# Altium footprint library Capacitors.PcbLib: 93 footprints (part 2 of 6)
Each footprint in its own frame and in the unit in brackets; x right, y up, seen from the top. Pads: shape width x height; smd on the part's side, far side on the other; paste and mask are expansions set on the pad; w line width, h text height; cw(c..) or ccw(c..) is an arc to the next point about the centre after c.
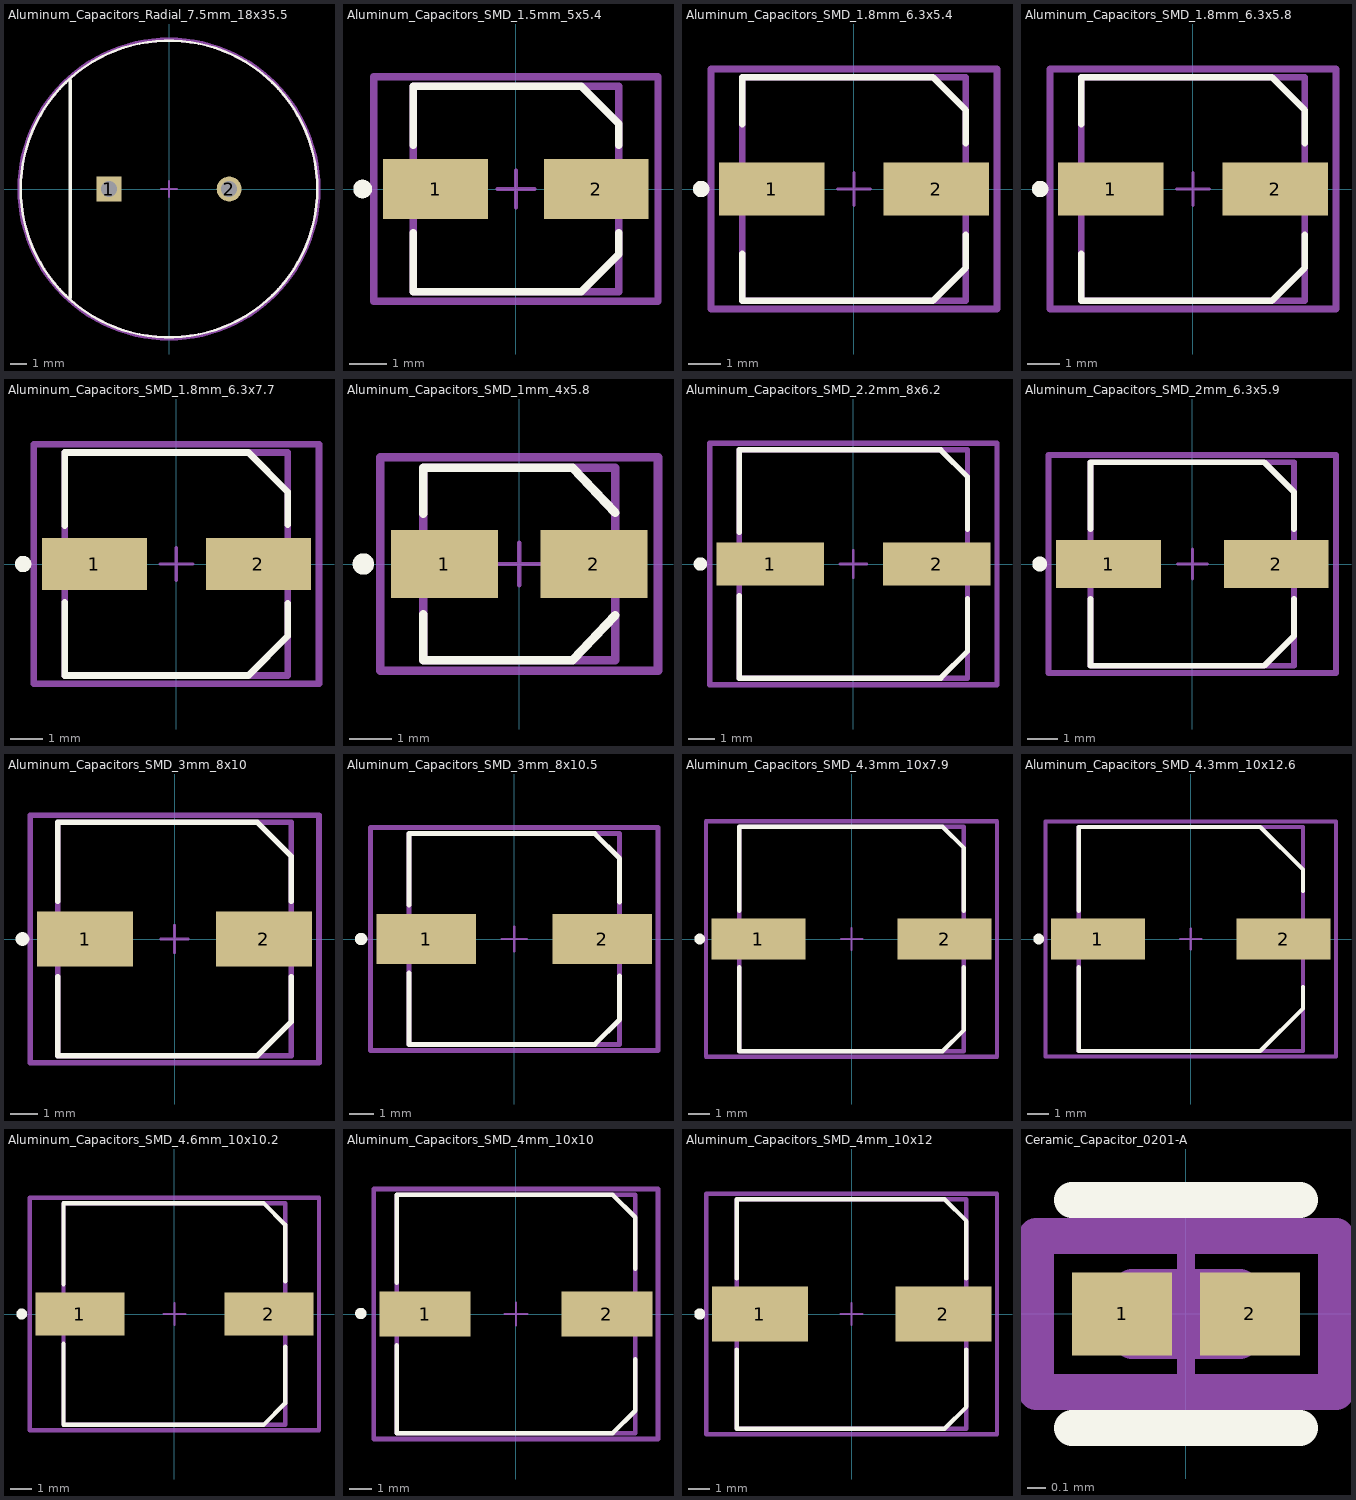
[diagram p1: the footprints below, top view; thin cyan lines are the x and y axes]

## Aluminum_Capacitors_Radial_7.5mm_18x35.5 [mm]
pads (2):
  rect 1.55x1.55 hole 1 paste-2539.97 mask+0: 1(-3.75,0)
  round 1.55 hole 1 paste-2539.97 mask+0: 2(3.75,0)
Top Overlay:
  circle w0.15: c0,0 r9.25
  lines w0.2: -6.15,-6.8 -6.15,6.8
Top 3D Body:
  circle w0.15: c0,0 r9.25
Top Courtyard:
  lines w0.2: -9.35,0 cw(c0,0) 9.35,0 cw(c0,0) -9.35,0
Top Component Center:
  lines w0.1: -0.5,0 0.5,0 ; 0,-0.5 0,0.5
3D body "Cap_Panasonic_ECA1VM472E_eec.STEP": height 0.25, standoff 0, extent -9.35,-9.35 9.35,9.35

## Aluminum_Capacitors_SMD_1.5mm_5x5.4 [mm]
pads (2):
  rect 2.8x1.6 smd paste+0 mask+0: 1(-2.15,0) 2(2.15,0)
Top Overlay:
  circle w0.25: c-4.1,0 r0.125
  lines w0.2: -2.75,-1.175 -2.75,-2.75 1.75,-2.75 2.75,-1.75 2.75,-1.175 ; -2.75,1.175 -2.75,2.75 1.75,2.75 2.75,1.75 2.75,1.175
Top Assembly:
  lines w0.2: -3.8,-3 -3.8,3 3.8,3 3.8,-3 -3.8,-3
Top 3D Body:
  lines w0.2: -2.75,-2.75 -2.75,2.75 2.75,2.75 2.75,-2.75 -2.75,-2.75
Top Courtyard:
  lines w0.2: -3.8,-3 -3.8,3 3.8,3 3.8,-3 -3.8,-3
Top Component Center:
  lines w0.1: -0.5,0 0.5,0 ; 0,-0.5 0,0.5
3D body "Cap_Panasonic_Electronic_Components_EEE-1AA101WR_eec.STEP": height 0.25, standoff 0, extent -3.8,-3 3.8,3

## Aluminum_Capacitors_SMD_1.8mm_6.3x5.4 [mm]
pads (2):
  rect 3.2x1.6 smd paste+0 mask+0: 1(-2.5,0) 2(2.5,0)
Top Overlay:
  circle w0.25: c-4.65,0 r0.125
  lines w0.2: -3.4,-1.975 -3.4,-3.4 2.4,-3.4 3.4,-2.4 3.4,-1.4 ; -3.4,1.975 -3.4,3.4 2.4,3.4 3.4,2.4 3.4,1.4
Top Assembly:
  lines w0.2: -4.35,-3.65 -4.35,3.65 4.35,3.65 4.35,-3.65 -4.35,-3.65
Top 3D Body:
  lines w0.2: -3.4,-3.4 -3.4,3.4 3.4,3.4 3.4,-3.4 -3.4,-3.4
Top Courtyard:
  lines w0.2: -4.35,-3.65 -4.35,3.65 4.35,3.65 4.35,-3.65 -4.35,-3.65
Top Component Center:
  lines w0.1: -0.5,0 0.5,0 ; 0,-0.5 0,0.5
3D body "Cap_Panasonic_EEE-1HA220WP_eec.STEP": height 0.25, standoff 0, extent -4.35,-3.65 4.35,3.65

## Aluminum_Capacitors_SMD_1.8mm_6.3x5.8 [mm]
pads (2):
  rect 3.2x1.6 smd paste+0 mask+0: 1(-2.5,0) 2(2.5,0)
Top Overlay:
  circle w0.25: c-4.65,0 r0.125
  lines w0.2: -3.4,-1.975 -3.4,-3.4 2.4,-3.4 3.4,-2.4 3.4,-1.4 ; -3.4,1.975 -3.4,3.4 2.4,3.4 3.4,2.4 3.4,1.4
Top Assembly:
  lines w0.2: -4.35,-3.65 4.35,-3.65 4.35,3.65 -4.35,3.65 -4.35,-3.65
Top 3D Body:
  lines w0.2: -3.4,-3.4 3.4,-3.4 3.4,3.4 -3.4,3.4 -3.4,-3.4
Top Courtyard:
  lines w0.2: -4.35,-3.65 4.35,-3.65 4.35,3.65 -4.35,3.65 -4.35,-3.65
Top Component Center:
  lines w0.1: -0.5,0 0.5,0 ; 0,-0.5 0,0.5
3D body "Cap_Panasonic_EEE-1HA220WP_eec.STEP": height 0.25, standoff 0, extent -4.35,-3.65 4.35,3.65

## Aluminum_Capacitors_SMD_1.8mm_6.3x7.7 [mm]
pads (2):
  rect 3.2x1.6 smd paste+0 mask+0: 1(-2.5,0) 2(2.5,0)
Top Overlay:
  circle w0.25: c-4.675,0 r0.125
  lines w0.2: -3.4,-1.175 -3.4,-3.4 2.2,-3.4 3.4,-2.2 3.4,-1.2 ; -3.4,1.175 -3.4,3.4 2.2,3.4 3.4,2.2 3.4,1.2
Top Assembly:
  lines w0.2: -4.35,-3.65 -4.35,3.65 4.35,3.65 4.35,-3.65 -4.35,-3.65
Top 3D Body:
  lines w0.2: -3.4,-3.4 -3.4,3.4 3.4,3.4 3.4,-3.4 -3.4,-3.4
Top Courtyard:
  lines w0.2: -4.35,-3.65 -4.35,3.65 4.35,3.65 4.35,-3.65 -4.35,-3.65
Top Component Center:
  lines w0.1: -0.5,0 0.5,0 ; 0,-0.5 0,0.5
3D body "Cap_Panasonic_EEEFK1C221XP_eec.STEP": height 0.25, standoff 0, extent -4.35,-3.65 4.35,3.65

## Aluminum_Capacitors_SMD_1mm_4x5.8 [mm]
pads (2):
  rect 2.5x1.6 smd paste+0 mask+0: 1(-1.75,0) 2(1.75,0)
Top Overlay:
  circle w0.25: c-3.65,0 r0.125
  lines w0.2: -2.25,-1.175 -2.25,-2.25 1.25,-2.25 2.25,-1.2 ; -2.25,1.175 -2.25,2.25 1.25,2.25 2.25,1.2
Top Assembly:
  lines w0.2: -3.25,-2.5 3.25,-2.5 3.25,2.5 -3.25,2.5 -3.25,-2.5
Top 3D Body:
  lines w0.2: -2.25,-2.25 2.25,-2.25 2.25,2.25 -2.25,2.25 -2.25,-2.25
Top Courtyard:
  lines w0.2: -3.25,-2.5 3.25,-2.5 3.25,2.5 -3.25,2.5 -3.25,-2.5
Top Component Center:
  lines w0.1: -0.5,0 0.5,0 ; 0,-0.5 0,0.5
3D body "Cap_Panasonic_EEEFK1E100R_eec.STEP": height 0.25, standoff 0, extent -3.25,-2.5 3.25,2.5

## Aluminum_Capacitors_SMD_2.2mm_8x6.2 [mm]
pads (2):
  rect 4x1.6 smd paste+0 mask+0: 1(-3.1,0) 2(3.1,0)
Top Overlay:
  circle w0.25: c-5.7,0 r0.125
  lines w0.2: -4.25,-1.175 -4.25,-4.25 3.25,-4.25 4.25,-3.25 4.25,-1.3 ; -4.25,1.175 -4.25,4.25 3.25,4.25 4.25,3.25 4.25,1.3
Top Assembly:
  lines w0.2: -5.35,-4.5 5.35,-4.5 5.35,4.5 -5.35,4.5 -5.35,-4.5
Top 3D Body:
  lines w0.2: -4.25,-4.25 4.25,-4.25 4.25,4.25 -4.25,4.25 -4.25,-4.25
Top Courtyard:
  lines w0.2: -5.35,-4.5 5.35,-4.5 5.35,4.5 -5.35,4.5 -5.35,-4.5
Top Component Center:
  lines w0.1: -0.5,0 0.5,0 ; 0,-0.5 0,0.5
3D body "Cap_Panasonic_EEEFK1E101P_eec.STEP": height 0.25, standoff 0, extent -5.35,-4.5 5.35,4.5

## Aluminum_Capacitors_SMD_2mm_6.3x5.9 [mm]
pads (2):
  rect 3.5x1.6 smd paste+0 mask+0: 1(-2.8,0) 2(2.8,0)
Top Overlay:
  circle w0.25: c-5.1,0 r0.125
  lines w0.2: -3.4,-1.175 -3.4,-3.4 2.4,-3.4 3.4,-2.4 3.4,-1.175 ; -3.4,1.175 -3.4,3.4 2.4,3.4 3.4,2.4 3.4,1.175
Top Assembly:
  lines w0.2: -4.8,-3.65 -4.8,3.65 4.8,3.65 4.8,-3.65 -4.8,-3.65
Top 3D Body:
  lines w0.2: -3.4,-3.4 -3.4,3.4 3.4,3.4 3.4,-3.4 -3.4,-3.4
Top Courtyard:
  lines w0.2: -4.8,-3.65 -4.8,3.65 4.8,3.65 4.8,-3.65 -4.8,-3.65
Top Component Center:
  lines w0.1: -0.5,0 0.5,0 ; 0,-0.5 0,0.5
3D body "Cap_Panasonic_20SVPK150M_eec.STEP": height 0.25, standoff 0, extent -4.8,-3.65 4.8,3.65

## Aluminum_Capacitors_SMD_3mm_8x10 [mm]
pads (2):
  rect 3.5x2 smd paste+0 mask+0: 1(-3.25,0) 2(3.25,0)
Top Overlay:
  circle w0.25: c-5.525,0 r0.125
  lines w0.2: -4.25,-1.375 -4.25,-4.25 3,-4.25 4.25,-3 4.25,-1.375 ; -4.25,1.375 -4.25,4.25 3,4.25 4.25,3 4.25,1.375
Top Assembly:
  lines w0.2: -5.25,-4.5 -5.25,4.5 5.25,4.5 5.25,-4.5 -5.25,-4.5
Top 3D Body:
  lines w0.2: -4.25,-4.25 -4.25,4.25 4.25,4.25 4.25,-4.25 -4.25,-4.25
Top Courtyard:
  lines w0.2: -5.25,-4.5 -5.25,4.5 5.25,4.5 5.25,-4.5 -5.25,-4.5
Top Component Center:
  lines w0.1: -0.5,0 0.5,0 ; 0,-0.5 0,0.5
3D body "Cap_Nichicon_PCR1E221MCL6GS_eec.STEP": height 0.25, standoff 0, extent -5.25,-4.5 5.25,4.5

## Aluminum_Capacitors_SMD_3mm_8x10.5 [mm]
pads (2):
  rect 4x2 smd paste+0 mask+0: 1(-3.55,0) 2(3.55,0)
Top Overlay:
  circle w0.25: c-6.175,0 r0.125
  lines w0.2: -4.25,-1.375 -4.25,-4.25 3.25,-4.25 4.25,-3.25 4.25,-1.5 ; -4.25,1.375 -4.25,4.25 3.25,4.25 4.25,3.25 4.25,1.5
Top Assembly:
  lines w0.2: -5.8,-4.5 -5.8,4.5 5.8,4.5 5.8,-4.5 -5.8,-4.5
Top 3D Body:
  lines w0.2: -4.25,-4.25 -4.25,4.25 4.25,4.25 4.25,-4.25 -4.25,-4.25
Top Courtyard:
  lines w0.2: -5.8,-4.5 -5.8,4.5 5.8,4.5 5.8,-4.5 -5.8,-4.5
Top Component Center:
  lines w0.1: -0.5,0 0.5,0 ; 0,-0.5 0,0.5
3D body "Cap_Panasonic_Electronic_Components_EEE-FP1V101AP_eec.STEP": height 0.25, standoff 0, extent -5.8,-4.5 5.8,4.5

## Aluminum_Capacitors_SMD_4.3mm_10x7.9 [mm]
pads (2):
  rect 4.4x1.9 smd paste+0 mask+0: 1(-4.35,0) 2(4.35,0)
Top Overlay:
  circle w0.25: c-7.1,0 r0.125
  lines w0.2: -5.25,-1.325 -5.25,-5.25 4.25,-5.25 5.25,-4.25 5.25,-1.325 ; -5.25,1.325 -5.25,5.25 4.25,5.25 5.25,4.25 5.25,1.325
Top Assembly:
  lines w0.2: -6.8,-5.5 -6.8,5.5 6.8,5.5 6.8,-5.5 -6.8,-5.5
Top 3D Body:
  lines w0.2: -5.25,-5.25 -5.25,5.25 5.25,5.25 5.25,-5.25 -5.25,-5.25
Top Courtyard:
  lines w0.2: -6.8,-5.5 -6.8,5.5 6.8,5.5 6.8,-5.5 -6.8,-5.5
Top Component Center:
  lines w0.1: -0.5,0 0.5,0 ; 0,-0.5 0,0.5
3D body "Cap_Panasonic_10SVPS150M_eec.STEP": height 0.25, standoff 0, extent -6.8,-5.5 6.8,5.5

## Aluminum_Capacitors_SMD_4.3mm_10x12.6 [mm]
pads (2):
  rect 4.4x1.9 smd paste+0 mask+0: 1(-4.35,0) 2(4.35,0)
Top Overlay:
  circle w0.25: c-7.125,0 r0.125
  lines w0.2: -5.25,-1.325 -5.25,-5.25 3.25,-5.25 5.25,-3.25 5.25,-2.25 ; -5.25,1.325 -5.25,5.25 3.25,5.25 5.25,3.25 5.25,2.25
Top Assembly:
  lines w0.2: -6.8,-5.5 -6.8,5.5 6.8,5.5 6.8,-5.5 -6.8,-5.5
Top 3D Body:
  lines w0.2: -5.25,-5.25 -5.25,5.25 5.25,5.25 5.25,-5.25 -5.25,-5.25
Top Courtyard:
  lines w0.2: -6.8,-5.5 -6.8,5.5 6.8,5.5 6.8,-5.5 -6.8,-5.5
Top Component Center:
  lines w0.1: -0.5,0 0.5,0 ; 0,-0.5 0,0.5
3D body "Cap_Panasonic_35SVPK330M_eec.STEP": height 0.25, standoff 0, extent -6.8,-5.5 6.8,5.5

## Aluminum_Capacitors_SMD_4.6mm_10x10.2 [mm]
pads (2):
  rect 4.1x2 smd paste+0 mask+0: 1(-4.35,0) 2(4.35,0)
Top Overlay:
  circle w0.25: c-7.025,0 r0.125
  lines w0.2: -5.1,-1.375 -5.1,-5.1 4.1,-5.1 5.1,-4.1 5.1,-1.5 ; -5.1,1.375 -5.1,5.1 4.1,5.1 5.1,4.1 5.1,1.5
Top Assembly:
  lines w0.2: -6.65,-5.35 6.65,-5.35 6.65,5.35 -6.65,5.35 -6.65,-5.35
Top 3D Body:
  lines w0.2: -5.1,-5.1 5.1,-5.1 5.1,5.1 -5.1,5.1 -5.1,-5.1
Top Courtyard:
  lines w0.2: -6.65,-5.35 6.65,-5.35 6.65,5.35 -6.65,5.35 -6.65,-5.35
Top Component Center:
  lines w0.1: -0.5,0 0.5,0 ; 0,-0.5 0,0.5
3D body "Cap_Panasonic_Electronic_Components_EEE-FC1E331AP_eec.STEP": height 0.25, standoff 0, extent -6.65,-5.35 6.65,5.35

## Aluminum_Capacitors_SMD_4mm_10x10 [mm]
pads (2):
  rect 4x2 smd paste+0 mask+0: 1(-4,0) 2(4,0)
Top Overlay:
  circle w0.25: c-6.825,0.025 r0.125
  lines w0.2: -5.25,-1.375 -5.25,-5.25 4.25,-5.25 5.25,-4.25 5.25,-2 ; -5.25,1.375 -5.25,5.25 4.25,5.25 5.25,4.25 5.25,2
Top Assembly:
  lines w0.2: -6.25,-5.5 6.25,-5.5 6.25,5.5 -6.25,5.5 -6.25,-5.5
Top 3D Body:
  lines w0.2: -5.25,-5.25 5.25,-5.25 5.25,5.25 -5.25,5.25 -5.25,-5.25
Top Courtyard:
  lines w0.2: -6.25,-5.5 6.25,-5.5 6.25,5.5 -6.25,5.5 -6.25,-5.5
Top Component Center:
  lines w0.1: -0.5,0 0.5,0 ; 0,-0.5 0,0.5
3D body "Cap_Nichicon_PCR1H121MCL1GS_eec.STEP": height 0.25, standoff 0, extent -6.25,-5.5 6.25,5.5

## Aluminum_Capacitors_SMD_4mm_10x12 [mm]
pads (2):
  rect 4.4x2.5 smd paste+0 mask+0: 1(-4.2,0) 2(4.2,0)
Top Overlay:
  circle w0.25: c-6.95,0 r0.125
  lines w0.2: -5.25,-1.625 -5.25,-5.25 4.25,-5.25 5.25,-4.25 5.25,-1.625 ; -5.25,1.625 -5.25,5.25 4.25,5.25 5.25,4.25 5.25,1.625
Top Assembly:
  lines w0.2: -6.65,-5.5 -6.65,5.5 6.65,5.5 6.65,-5.5 -6.65,-5.5
Top 3D Body:
  lines w0.2: -5.25,-5.25 -5.25,5.25 5.25,5.25 5.25,-5.25 -5.25,-5.25
Top Courtyard:
  lines w0.2: -6.65,-5.5 -6.65,5.5 6.65,5.5 6.65,-5.5 -6.65,-5.5
Top Component Center:
  lines w0.1: -0.5,0 0.5,0 ; 0,-0.5 0,0.5
3D body "Cap_Vishay_BC_Components_MAL214699105E3_eec.STEP": height 0.25, standoff 0, extent -6.65,-5.5 6.65,5.5

## Ceramic_Capacitor_0201-A [mm]
pads (2):
  rect 0.554x0.463 smd paste+0 mask+0: 1(-0.354,0) 2(0.354,0)
Top Overlay:
  lines w0.2: -0.631,-0.631 0.631,-0.631 ; -0.631,0.631 0.631,0.631
Top Assembly:
  lines w0.2: -0.831,-0.431 -0.831,0.431 0.831,0.431 0.831,-0.431 -0.831,-0.431
Top 3D Body:
  lines w0.2: -0.3,-0.15 -0.3,0.15 0.3,0.15 0.3,-0.15 -0.3,-0.15
Top Courtyard:
  lines w0.2: -0.831,-0.431 -0.831,0.431 0.831,0.431 0.831,-0.431 -0.831,-0.431
Top Component Center:
  lines w0.1: -0.5,0 0.5,0 ; 0,-0.5 0,0.5
3D body "Cap_Murata_GRM0335C1HR30BA01D_eec.STEP": height 0.25, standoff 0, extent -0.831,-0.431 0.831,0.431